# Altium footprint library con-amp.PCBLIB: 295 footprints (part 9 of 19)
Each footprint in its own frame and in the unit in brackets; x right, y up, seen from the top. Pads: shape width x height; smd on the part's side, far side on the other; paste and mask are expansions set on the pad; w line width, h text height; cw(c..) or ccw(c..) is an arc to the next point about the centre after c.
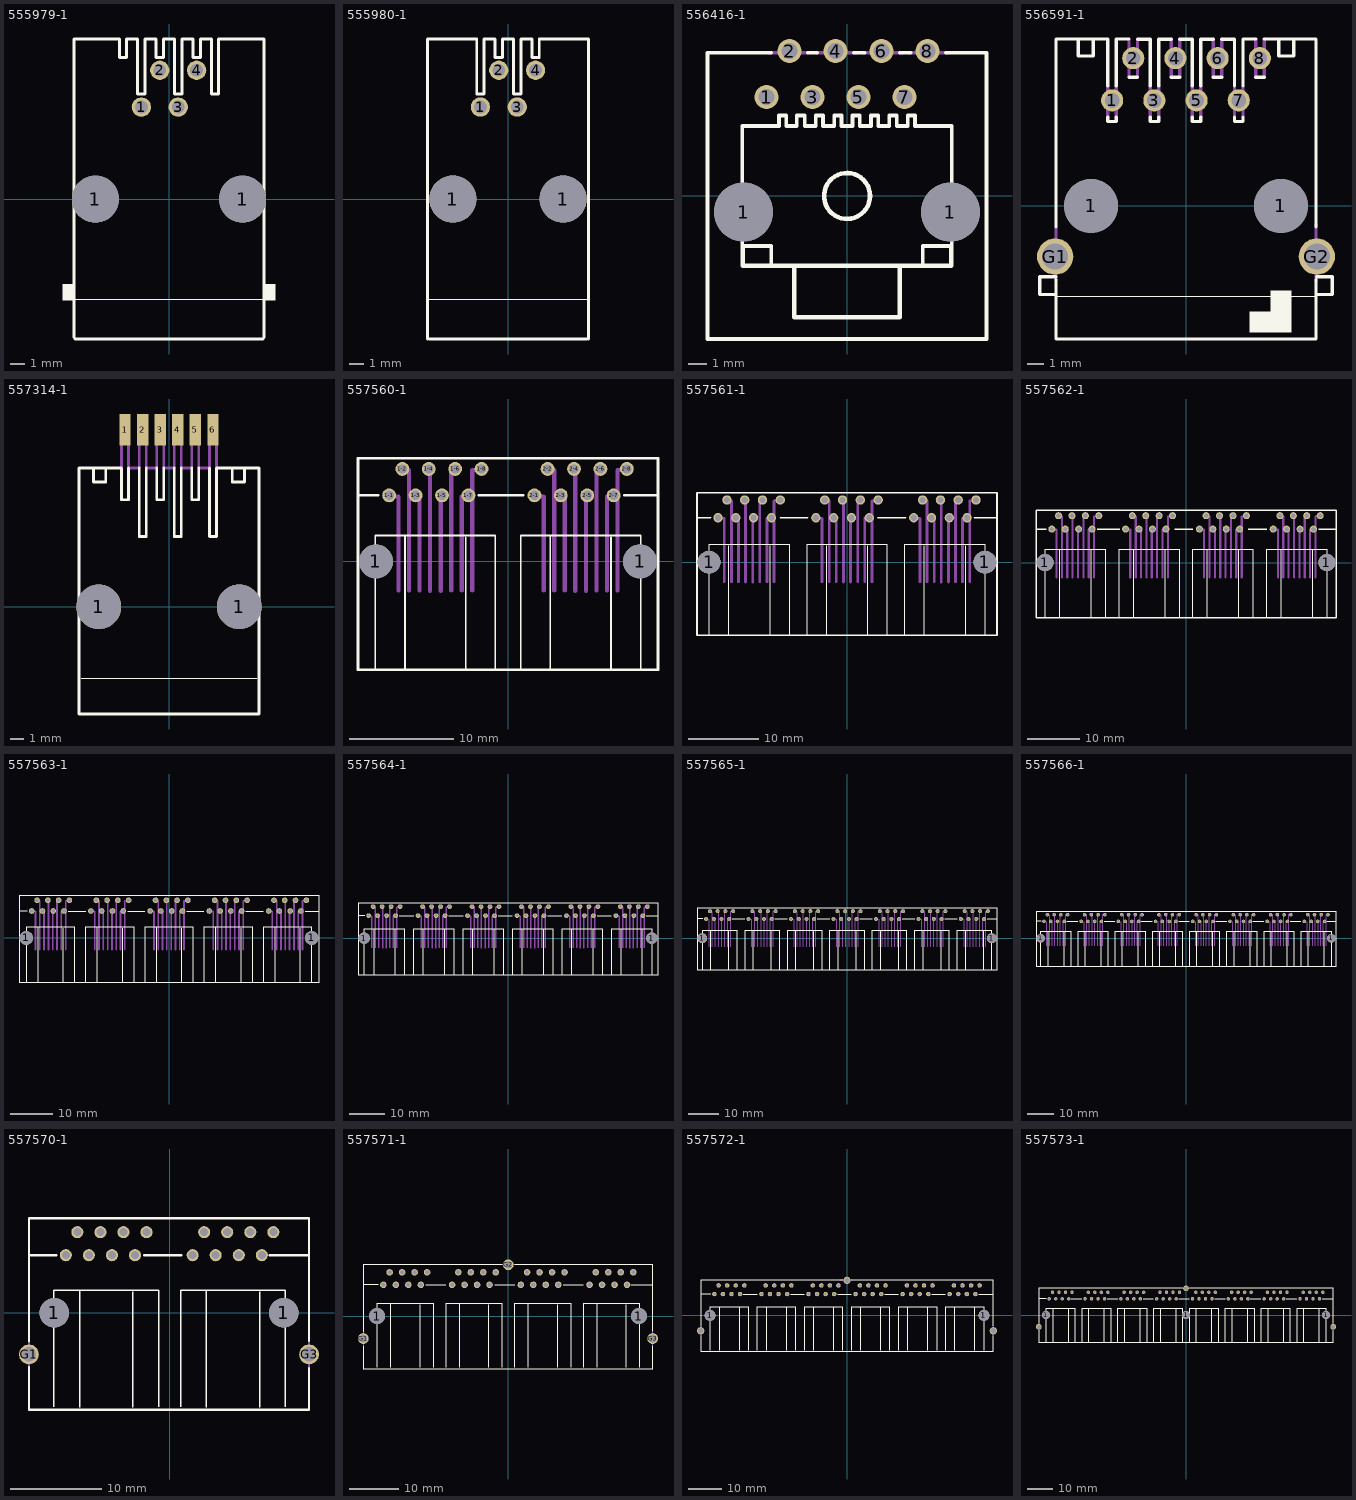
[diagram p8: the footprints below, top view; thin cyan lines are the x and y axes]

## 555979-1 [mil]
pads (6):
  round 128 hole 128: 1(-200,0) 1(200,0)
  round 52.5 hole 35: 1(-75,250) 2(-25,350) 3(25,250) 4(75,350)
Top Overlay:
  rectangle: -290,-275 -260,-230
  rectangle: 260,-275 290,-230
  lines w2: -257.5,-272.5 257.5,-272.5
  lines w8: -258.35,-375.51 -258.35,434.8 -135,435 -135,385 -115,385 -115,434.8 ; -255,-380 255,-380 ; -115,435 -115,434.8 ; -85,435 -85,434.8 ; 115,434.8 85,434.8 85,385 65,385 65,435 35,435 35,285 15,285 15,435 -15,435 -15,385 -35,385 -35,435 -65,435 -65,285 -85,285 -85,434.8 ; 115,435 115,285 135,285 135,435 258.35,434.8 258.35,-375.51 ; -115,434.8 -85,434.8

## 555980-1 [mil]
pads (6):
  round 128 hole 128: 1(-150,0) 1(150,0)
  round 52.5 hole 35: 1(-75,250) 2(-25,350) 3(25,250) 4(75,350)
Top Overlay:
  lines w2: -217.5,-272.5 217.5,-272.5
  lines w8: -218.35,-380.51 -218.35,434.8 -85,434.8 ; -215,-380 215,-380 ; -85,435 -85,434.8 ; 85,435 85,434.8 ; 218.35,-380.51 218.35,434.8 85,434.8 ; -85,434.8 -85,285 -65,285 -65,435 -35,435 -35,385 -15,385 -15,435 15,435 15,285 35,285 35,435 65,435 65,385 85,385 85,434.8

## 556416-1 [mil]
pads (10):
  round 128 hole 128: 1(-225,-35) 1(225,-35)
  round 52.5 hole 35: 1(-175,215) 2(-125,315) 3(-75,215) 4(-25,315) 5(25,215) 6(75,315) 7(125,215) 8(175,315)
Top Overlay:
  circle w10: c0,0 r50
  lines w8: -165,-152 -165,-109 -228,-109 -228,152 -148,152 -148,175 -132,175 -132,152 -109,152 -109,175 -92,175 -92,152 -68,152 -68,175 -52,175 -52,152 -28,152 -28,175 -12,175 -12,152 12,152 12,175 28,175 28,152 52,152 52,175 68,175 68,152 92,152 92,175 108,175 108,152 132,152 132,175 148,175 148,152 228,152 228,-109 165,-109 165,-152 ; -165,311.02 -303.35,311.02 -303.35,-311.02 303.35,-311.02 303.35,311.02 215,311.02 ; -85,311.02 -65,311.02 ; 15,311.02 38.35,311.02 ; 115,311.02 138.35,311.02
  lines w10: -227,-110 -227,-152 227,-152 227,-111 ; -115,-154 -115,-264 115,-264 115,-154
Mechanical 16:
  lines w8: -170,311.02 -85,311.02 ; -65,311.02 20,311.02 ; 35,311.02 120,311.02 ; 135,311.02 220,311.02

## 556591-1 [mil]
pads (12):
  round 128 hole 128: 1(-225,0) 1(225,0)
  round 52.5 hole 35: 1(-175,250) 2(-125,350) 3(-75,250) 4(-25,350) 5(25,250) 6(75,350) 7(125,250) 8(175,350)
  round 86 hole 62: G1(-310,-120) G2(310,-120)
Top Overlay:
  rectangle: 150,-300 250,-250
  rectangle: 200,-250 250,-200
  lines w2: -310,-214 310,-214
  lines w8: -308.86,-168.23 -346.42,-168.23 -346.42,-209.88 -308.82,-209.88 ; -307.91,-175 -307.91,-315.39 307.91,-315.39 307.91,-175 ; -307.91,-50 -307.91,395.39 -185,395.39 ; -255,395 -255,355 -220,355 -220,395 ; -185,210 -185,200 -165,200 -165,210 ; -185,285 -185,395 ; -165,285 -165,395.39 -135,395.39 ; -135,305 -115,305 ; -115,395 -85,395 -85,285 ; -85,210 -85,200 -65,200 -65,210 ; -65,285 -65,395.39 ; -65,395 -35,395 ; -35,305 -15,305 ; -15,395 15,395 15,285 ; 15,210 15,200 35,200 35,210 ; 35,285 35,395.39 ; 35,395 65,395 ; 65,305 85,305 ; 85,395 115,395 115,285 ; 115,210 115,200 135,200 135,210 ; 135,285 135,395.39 165,395.39 ; 165,305 185,305 ; 185,395.39 307.91,395.39 307.91,-50 ; 220,395 220,355 255,355 255,395 ; 309.8,-209.88 346.42,-209.88 346.42,-168.23 309.84,-168.23
Mechanical 16:
  lines w8: -308,-175 -308,-50 ; -185,210 -185,285 ; -165,210 -165,285 ; -135,305 -135,395.39 ; -115,305 -115,395 ; -85,210 -85,285 ; -65,210 -65,285 ; -35,305 -35,395 ; -15,305 -15,395 ; 15,210 15,285 ; 35,210 35,285 ; 65,305 65,395 ; 85,305 85,395 ; 115,210 115,285 ; 135,210 135,285 ; 165,305 165,395.39 ; 185,305 185,395 ; 308,-177 308,-45

## 557314-1 [mil]
pads (8):
  round 128 hole 128: 1(-200,0) 1(200,0)
  rect 32x90 smd: 1(-125,504.06) 2(-75,504.06) 3(-25,504.06) 4(25,504.06) 5(75,504.06) 6(125,504.06)
Top Overlay:
  lines w2: -250,-203 250,-203
  lines w8: -215,395 -215,355 -180,355 -180,395 ; -115,395 -115,305 -135,305 -135,395.39 -255.91,395.39 -255.91,-305.39 255.91,-305.39 255.91,395.39 135,395.39 135,200 115,200 115,395 ; -85,395 -85,200 -65,200 -65,395.39 ; -35,395 -35,305 -15,305 -15,395 ; 15,395 15,200 35,200 35,395.39 ; 65,395 65,305 85,305 85,395 ; 180,395 180,355 215,355 215,395
Mechanical 16:
  lines w8: -135,400 -135,544.06 -115,544.06 -115,400 ; -115,395 -85,395 ; -85,400 -85,544.06 -65,544.06 -65,400 ; -65,395 -35,395 ; -35,400 -35,544.06 -15,544.06 -15,400 ; -15,395 15,395 ; 15,400 15,544.06 35,544.06 35,400 ; 35,395 65,395 ; 65,400 65,544.06 85,544.06 85,400 ; 85,395 115,395 ; 115,400 115,544.06 135,544.06 135,400

## 557560-1 [mil]
pads (18):
  round 128 hole 128: 1(-500,0) 1(500,0)
  round 52.5 hole 35: 1-1(-450,250) 1-2(-400,350) 1-3(-350,250) 1-4(-300,350) 1-5(-250,250) 1-6(-200,350) 1-7(-150,250) 1-8(-100,350) 2-1(100,250) 2-2(150,350) 2-3(200,250) 2-4(250,350) 2-5(300,250) 2-6(350,350) 2-7(400,250) 2-8(450,350)
Top Overlay:
  lines w6: -502,-408 -502,98 -48,98 -48,-408 ; -390,-410 -390,93 ; -160,-410 -160,92 ; 48,-408 48,98 502,98 502,-408 ; 160,-410 160,93 ; 390,-410 390,92
  lines w10: -492,250 -568,250 ; -110,250 -18,250 ; 25,250 -18,250 ; 58,250 -18,250 ; 440,250 568,250 ; -568,250 -568,390 568,390 568,250 ; -568,250 -568,-410 -390,-410 -160,-410 160,-410 390,-410 568,-410 568,250
Mechanical 16:
  lines w16: -450,250 -415,245 -415,-110 ; -400,349 -375,345 -375,-110 ; -350,250 -335,247 ; -335,-110 -335,245 ; -300,350 -295,349 ; -295,-111 -295,345 ; -255,-111 -255,245 ; -255,248 -250,250 ; -215,-110 -215,345 ; -215,347 -200,350 ; -175,-110 -175,245 ; -175,246 -150,250 ; -135,-110 -135,345 -100,350 ; 100,250 135,245 135,-110 ; 150,349 175,345 175,-110 ; 200,250 215,247 ; 215,-110 215,245 ; 250,350 255,349 ; 255,-111 255,345 ; 295,-111 295,245 ; 295,248 300,250 ; 335,-110 335,345 ; 335,347 350,350 ; 375,-110 375,245 ; 375,246 400,250 ; 415,-110 415,345 450,350

## 557561-1 [mil]
pads (26):
  round 128 hole 128: 1(-775,0) 1(775,0)
  round 52.5 hole 35: 1-1(-725,250) 1-2(-675,350) 1-3(-625,250) 1-4(-575,350) 1-5(-525,250) 1-6(-475,350) 1-7(-425,250) 1-8(-375,350) 2-1(-175,250) 2-2(-125,350) 2-3(-75,250) 2-4(-25,350) 2-5(25,250) 2-6(75,350) 2-7(125,250) 2-8(175,350) 3-1(375,250) 3-2(425,350) 3-3(475,250) 3-4(525,350) 3-5(575,250) 3-6(625,350) 3-7(675,250) 3-8(725,350)
Top Overlay:
  lines w6: -777,-408 -777,98 -323,98 -323,-408 ; -665,-410 -665,93 ; -435,-410 -435,92 ; -227,-408 -227,98 227,98 227,-408 ; -115,-410 -115,93 ; 115,-410 115,92 ; 323,-408 323,98 777,98 777,-408 ; 435,-410 435,93 ; 665,-410 665,92
  lines w10: -767,250 -843,250 ; -375,250 -220,250 ; 175,250 330,250 ; 715,250 843,250 ; -843,250 -843,390 843,390 843,250 ; -843,250 -843,-410 -665,-410 -435,-410 -115,-410 115,-410 435,-410 665,-410 843,-410 843,250
Mechanical 16:
  lines w16: -725,250 -690,245 -690,-110 ; -675,349 -650,345 -650,-110 ; -625,250 -610,247 ; -610,-110 -610,245 ; -575,350 -570,349 ; -570,-111 -570,345 ; -530,-111 -530,245 ; -530,248 -525,250 ; -490,-110 -490,345 ; -490,347 -475,350 ; -450,-110 -450,245 ; -450,246 -425,250 ; -410,-110 -410,345 -375,350 ; -175,250 -140,245 -140,-110 ; -125,349 -100,345 -100,-110 ; -75,250 -60,247 ; -60,-110 -60,245 ; -25,350 -20,349 ; -20,-111 -20,345 ; 20,-111 20,245 ; 20,248 25,250 ; 60,-110 60,345 ; 60,347 75,350 ; 100,-110 100,245 ; 100,246 125,250 ; 140,-110 140,345 175,350 ; 375,250 410,245 410,-110 ; 425,349 450,345 450,-110 ; 475,250 490,247 ; 490,-110 490,245 ; 525,350 530,349 ; 530,-111 530,345 ; 570,-111 570,245 ; 570,248 575,250 ; 610,-110 610,345 ; 610,347 625,350 ; 650,-110 650,245 ; 650,246 675,250 ; 690,-110 690,345 725,350

## 557562-1 [mil]
pads (34):
  round 128 hole 128: 1(-1050,0) 1(1050,0)
  round 52.5 hole 35: 1-1(-1000,250) 1-2(-950,350) 1-3(-900,250) 1-4(-850,350) 1-5(-800,250) 1-6(-750,350) 1-7(-700,250) 1-8(-650,350) 2-1(-450,250) 2-2(-400,350) 2-3(-350,250) 2-4(-300,350) 2-5(-250,250) 2-6(-200,350) 2-7(-150,250) 2-8(-100,350) 3-1(100,250) 3-2(150,350) 3-3(200,250) 3-4(250,350) 3-5(300,250) 3-6(350,350) 3-7(400,250) 3-8(450,350) 4-1(650,250) 4-2(700,350) 4-3(750,250) 4-4(800,350) 4-5(850,250) 4-6(900,350) 4-7(950,250) 4-8(1000,350)
Top Overlay:
  lines w6: -1052,-408 -1052,98 -598,98 -598,-408 ; -940,-410 -940,93 ; -710,-410 -710,92 ; -502,-408 -502,98 -48,98 -48,-408 ; -390,-410 -390,93 ; -160,-410 -160,92 ; 48,-408 48,98 502,98 502,-408 ; 160,-410 160,93 ; 390,-410 390,92 ; 598,-408 598,98 1052,98 1052,-408 ; 710,-410 710,93 ; 940,-410 940,92
  lines w10: -1042,250 -1118,250 ; -660,250 -568,250 ; -525,250 -568,250 ; -492,250 -568,250 ; -85,250 50,250 ; 465,250 600,250 ; 990,250 1118,250 ; -1118,250 -1118,390 1118,390 1118,250 ; -1118,250 -1118,-410 -940,-410 -710,-410 -390,-410 -160,-410 160,-410 390,-410 710,-410 940,-410 1118,-410 1118,250
Mechanical 16:
  lines w16: -1000,250 -965,245 -965,-110 ; -950,349 -925,345 -925,-110 ; -900,250 -885,247 ; -885,-110 -885,245 ; -850,350 -845,349 ; -845,-111 -845,345 ; -805,-111 -805,245 ; -805,248 -800,250 ; -765,-110 -765,345 ; -765,347 -750,350 ; -725,-110 -725,245 ; -725,246 -700,250 ; -685,-110 -685,345 -650,350 ; -450,250 -415,245 -415,-110 ; -400,349 -375,345 -375,-110 ; -350,250 -335,247 ; -335,-110 -335,245 ; -300,350 -295,349 ; -295,-111 -295,345 ; -255,-111 -255,245 ; -255,248 -250,250 ; -215,-110 -215,345 ; -215,347 -200,350 ; -175,-110 -175,245 ; -175,246 -150,250 ; -135,-110 -135,345 -100,350 ; 100,250 135,245 135,-110 ; 150,349 175,345 175,-110 ; 200,250 215,247 ; 215,-110 215,245 ; 250,350 255,349 ; 255,-111 255,345 ; 295,-111 295,245 ; 295,248 300,250 ; 335,-110 335,345 ; 335,347 350,350 ; 375,-110 375,245 ; 375,246 400,250 ; 415,-110 415,345 450,350 ; 650,250 685,245 685,-110 ; 700,349 725,345 725,-110 ; 750,250 765,247 ; 765,-110 765,245 ; 800,350 805,349 ; 805,-111 805,345 ; 845,-111 845,245 ; 845,248 850,250 ; 885,-110 885,345 ; 885,347 900,350 ; 925,-110 925,245 ; 925,246 950,250 ; 965,-110 965,345 1000,350

## 557563-1 [mil]
pads (42):
  round 128 hole 128: 1(-1325,0) 1(1325,0)
  round 52.5 hole 35: 1-1(-1275,250) 1-2(-1225,350) 1-3(-1175,250) 1-4(-1125,350) 1-5(-1075,250) 1-6(-1025,350) 1-7(-975,250) 1-8(-925,350) 2-1(-725,250) 2-2(-675,350) 2-3(-625,250) 2-4(-575,350) 2-5(-525,250) 2-6(-475,350) 2-7(-425,250) 2-8(-375,350) 3-1(-175,250) 3-2(-125,350) 3-3(-75,250) 3-4(-25,350) 3-5(25,250) 3-6(75,350) 3-7(125,250) 3-8(175,350) 4-1(375,250) 4-2(425,350) 4-3(475,250) 4-4(525,350) 4-5(575,250) 4-6(625,350) 4-7(675,250) 4-8(725,350) 5-1(925,250) 5-2(975,350) 5-3(1025,250) 5-4(1075,350) 5-5(1125,250) 5-6(1175,350) 5-7(1225,250) 5-8(1275,350)
Top Overlay:
  lines w6: -1327,-408 -1327,98 -873,98 -873,-408 ; -1215,-410 -1215,93 ; -985,-410 -985,92 ; -777,-408 -777,98 -323,98 -323,-408 ; -665,-410 -665,93 ; -435,-410 -435,92 ; -227,-408 -227,98 227,98 227,-408 ; -115,-410 -115,93 ; 115,-410 115,92 ; 323,-408 323,98 777,98 777,-408 ; 435,-410 435,93 ; 665,-410 665,92 ; 873,-408 873,98 1327,98 1327,-408 ; 985,-410 985,93 ; 1215,-410 1215,92
  lines w10: -1317,250 -1393,250 ; -935,250 -775,250 ; -385,250 -225,250 ; 165,250 325,250 ; 715,250 875,250 ; 1265,250 1393,250 ; -1393,250 -1393,390 1393,390 1393,250 ; -1393,250 -1393,-410 -1215,-410 -985,-410 -665,-410 -435,-410 -115,-410 115,-410 435,-410 665,-410 985,-410 1215,-410 1393,-410 1393,250
Mechanical 16:
  lines w16: -1275,250 -1240,245 -1240,-110 ; -1225,349 -1200,345 -1200,-110 ; -1175,250 -1160,247 ; -1160,-110 -1160,245 ; -1125,350 -1120,349 ; -1120,-111 -1120,345 ; -1080,-111 -1080,245 ; -1080,248 -1075,250 ; -1040,-110 -1040,345 ; -1040,347 -1025,350 ; -1000,-110 -1000,245 ; -1000,246 -975,250 ; -960,-110 -960,345 -925,350 ; -725,250 -690,245 -690,-110 ; -675,349 -650,345 -650,-110 ; -625,250 -610,247 ; -610,-110 -610,245 ; -575,350 -570,349 ; -570,-111 -570,345 ; -530,-111 -530,245 ; -530,248 -525,250 ; -490,-110 -490,345 ; -490,347 -475,350 ; -450,-110 -450,245 ; -450,246 -425,250 ; -410,-110 -410,345 -375,350 ; -175,250 -140,245 -140,-110 ; -125,349 -100,345 -100,-110 ; -75,250 -60,247 ; -60,-110 -60,245 ; -25,350 -20,349 ; -20,-111 -20,345 ; 20,-111 20,245 ; 20,248 25,250 ; 60,-110 60,345 ; 60,347 75,350 ; 100,-110 100,245 ; 100,246 125,250 ; 140,-110 140,345 175,350 ; 375,250 410,245 410,-110 ; 425,349 450,345 450,-110 ; 475,250 490,247 ; 490,-110 490,245 ; 525,350 530,349 ; 530,-111 530,345 ; 570,-111 570,245 ; 570,248 575,250 ; 610,-110 610,345 ; 610,347 625,350 ; 650,-110 650,245 ; 650,246 675,250 ; 690,-110 690,345 725,350 ; 925,250 960,245 960,-110 ; 975,349 1000,345 1000,-110 ; 1025,250 1040,247 ; 1040,-110 1040,245 ; 1075,350 1080,349 ; 1080,-111 1080,345 ; 1120,-111 1120,245 ; 1120,248 1125,250 ; 1160,-110 1160,345 ; 1160,347 1175,350 ; 1200,-110 1200,245 ; 1200,246 1225,250 ; 1240,-110 1240,345 1275,350

## 557564-1 [mil]
pads (50):
  round 128 hole 128: 1(-1600,0) 1(1600,0)
  round 52.5 hole 35: 1-1(-1550,250) 1-2(-1500,350) 1-3(-1450,250) 1-4(-1400,350) 1-5(-1350,250) 1-6(-1300,350) 1-7(-1250,250) 1-8(-1200,350) 2-1(-1000,250) 2-2(-950,350) 2-3(-900,250) 2-4(-850,350) 2-5(-800,250) 2-6(-750,350) 2-7(-700,250) 2-8(-650,350) 3-1(-450,250) 3-2(-400,350) 3-3(-350,250) 3-4(-300,350) 3-5(-250,250) 3-6(-200,350) 3-7(-150,250) 3-8(-100,350) 4-1(100,250) 4-2(150,350) 4-3(200,250) 4-4(250,350) 4-5(300,250) 4-6(350,350) 4-7(400,250) 4-8(450,350) 5-1(650,250) 5-2(700,350) 5-3(750,250) 5-4(800,350) 5-5(850,250) 5-6(900,350) 5-7(950,250) 5-8(1000,350) 6-1(1200,250) 6-2(1250,350) 6-3(1300,250) 6-4(1350,350) 6-5(1400,250) 6-6(1450,350) 6-7(1500,250) 6-8(1550,350)
Top Overlay:
  lines w6: -1602,-408 -1602,98 -1148,98 -1148,-408 ; -1490,-410 -1490,93 ; -1260,-410 -1260,92 ; -1052,-408 -1052,98 -598,98 -598,-408 ; -940,-410 -940,93 ; -710,-410 -710,92 ; -502,-408 -502,98 -48,98 -48,-408 ; -390,-410 -390,93 ; -160,-410 -160,92 ; 48,-408 48,98 502,98 502,-408 ; 160,-410 160,93 ; 390,-410 390,92 ; 598,-408 598,98 1052,98 1052,-408 ; 710,-410 710,93 ; 940,-410 940,92 ; 1148,-408 1148,98 1602,98 1602,-408 ; 1260,-410 1260,93 ; 1490,-410 1490,92
  lines w10: -1592,250 -1668,250 ; -1210,250 -1050,250 ; -660,250 -500,250 ; -110,250 50,250 ; 440,250 600,250 ; 990,250 1150,250 ; 1540,250 1668,250 ; -1668,250 -1668,390 1668,390 1668,250 ; -1668,250 -1668,-410 -1490,-410 -1260,-410 -940,-410 -710,-410 -390,-410 -160,-410 160,-410 390,-410 710,-410 940,-410 1260,-410 1490,-410 1668,-410 1668,250
Mechanical 16:
  lines w16: -1550,250 -1515,245 -1515,-110 ; -1500,349 -1475,345 -1475,-110 ; -1450,250 -1435,247 ; -1435,-110 -1435,245 ; -1400,350 -1395,349 ; -1395,-111 -1395,345 ; -1355,-111 -1355,245 ; -1355,248 -1350,250 ; -1315,-110 -1315,345 ; -1315,347 -1300,350 ; -1275,-110 -1275,245 ; -1275,246 -1250,250 ; -1235,-110 -1235,345 -1200,350 ; -1000,250 -965,245 -965,-110 ; -950,349 -925,345 -925,-110 ; -900,250 -885,247 ; -885,-110 -885,245 ; -850,350 -845,349 ; -845,-111 -845,345 ; -805,-111 -805,245 ; -805,248 -800,250 ; -765,-110 -765,345 ; -765,347 -750,350 ; -725,-110 -725,245 ; -725,246 -700,250 ; -685,-110 -685,345 -650,350 ; -450,250 -415,245 -415,-110 ; -400,349 -375,345 -375,-110 ; -350,250 -335,247 ; -335,-110 -335,245 ; -300,350 -295,349 ; -295,-111 -295,345 ; -255,-111 -255,245 ; -255,248 -250,250 ; -215,-110 -215,345 ; -215,347 -200,350 ; -175,-110 -175,245 ; -175,246 -150,250 ; -135,-110 -135,345 -100,350 ; 100,250 135,245 135,-110 ; 150,349 175,345 175,-110 ; 200,250 215,247 ; 215,-110 215,245 ; 250,350 255,349 ; 255,-111 255,345 ; 295,-111 295,245 ; 295,248 300,250 ; 335,-110 335,345 ; 335,347 350,350 ; 375,-110 375,245 ; 375,246 400,250 ; 415,-110 415,345 450,350 ; 650,250 685,245 685,-110 ; 700,349 725,345 725,-110 ; 750,250 765,247 ; 765,-110 765,245 ; 800,350 805,349 ; 805,-111 805,345 ; 845,-111 845,245 ; 845,248 850,250 ; 885,-110 885,345 ; 885,347 900,350 ; 925,-110 925,245 ; 925,246 950,250 ; 965,-110 965,345 1000,350 ; 1200,250 1235,245 1235,-110 ; 1250,349 1275,345 1275,-110 ; 1300,250 1315,247 ; 1315,-110 1315,245 ; 1350,350 1355,349 ; 1355,-111 1355,345 ; 1395,-111 1395,245 ; 1395,248 1400,250 ; 1435,-110 1435,345 ; 1435,347 1450,350 ; 1475,-110 1475,245 ; 1475,246 1500,250 ; 1515,-110 1515,345 1550,350

## 557565-1 [mil]
pads (58):
  round 128 hole 128: 1(-1875,0) 1(1875,0)
  round 52.5 hole 35: 1-1(-1825,250) 1-2(-1775,350) 1-3(-1725,250) 1-4(-1675,350) 1-5(-1625,250) 1-6(-1575,350) 1-7(-1525,250) 1-8(-1475,350) 2-1(-1275,250) 2-2(-1225,350) 2-3(-1175,250) 2-4(-1125,350) 2-5(-1075,250) 2-6(-1025,350) 2-7(-975,250) 2-8(-925,350) 3-1(-725,250) 3-2(-675,350) 3-3(-625,250) 3-4(-575,350) 3-5(-525,250) 3-6(-475,350) 3-7(-425,250) 3-8(-375,350) 4-1(-175,250) 4-2(-125,350) 4-3(-75,250) 4-4(-25,350) 4-5(25,250) 4-6(75,350) 4-7(125,250) 4-8(175,350) 5-1(375,250) 5-2(425,350) 5-3(475,250) 5-4(525,350) 5-5(575,250) 5-6(625,350) 5-7(675,250) 5-8(725,350) 6-1(925,250) 6-2(975,350) 6-3(1025,250) 6-4(1075,350) 6-5(1125,250) 6-6(1175,350) 6-7(1225,250) 6-8(1275,350) 7-1(1475,250) 7-2(1525,350) 7-3(1575,250) 7-4(1625,350) 7-5(1675,250) 7-6(1725,350) 7-7(1775,250) 7-8(1825,350)
Top Overlay:
  lines w6: -1877,-408 -1877,98 -1423,98 -1423,-408 ; -1765,-410 -1765,93 ; -1535,-410 -1535,92 ; -1327,-408 -1327,98 -873,98 -873,-408 ; -1215,-410 -1215,93 ; -985,-410 -985,92 ; -777,-408 -777,98 -323,98 -323,-408 ; -665,-410 -665,93 ; -435,-410 -435,92 ; -227,-408 -227,98 227,98 227,-408 ; -115,-410 -115,93 ; 115,-410 115,92 ; 323,-408 323,98 777,98 777,-408 ; 435,-410 435,93 ; 665,-410 665,92 ; 873,-408 873,98 1327,98 1327,-408 ; 985,-410 985,93 ; 1215,-410 1215,92 ; 1423,-408 1423,98 1877,98 1877,-408 ; 1535,-410 1535,93 ; 1765,-410 1765,92
  lines w10: -1867,250 -1943,250 ; -1485,250 -1325,250 ; -935,250 -775,250 ; -385,250 -225,250 ; 165,250 325,250 ; 715,250 875,250 ; 1265,250 1425,250 ; 1815,250 1943,250 ; -1943,250 -1943,390 1943,390 1943,250 ; -1943,250 -1943,-410 -1765,-410 -1535,-410 -1215,-410 -985,-410 -665,-410 -435,-410 -115,-410 115,-410 435,-410 665,-410 985,-410 1215,-410 1535,-410 1765,-410 1943,-410 1943,250
Mechanical 16:
  lines w16: -1825,250 -1790,245 -1790,-110 ; -1775,349 -1750,345 -1750,-110 ; -1725,250 -1710,247 ; -1710,-110 -1710,245 ; -1675,350 -1670,349 ; -1670,-111 -1670,345 ; -1630,-111 -1630,245 ; -1630,248 -1625,250 ; -1590,-110 -1590,345 ; -1590,347 -1575,350 ; -1550,-110 -1550,245 ; -1550,246 -1525,250 ; -1510,-110 -1510,345 -1475,350 ; -1275,250 -1240,245 -1240,-110 ; -1225,349 -1200,345 -1200,-110 ; -1175,250 -1160,247 ; -1160,-110 -1160,245 ; -1125,350 -1120,349 ; -1120,-111 -1120,345 ; -1080,-111 -1080,245 ; -1080,248 -1075,250 ; -1040,-110 -1040,345 ; -1040,347 -1025,350 ; -1000,-110 -1000,245 ; -1000,246 -975,250 ; -960,-110 -960,345 -925,350 ; -725,250 -690,245 -690,-110 ; -675,349 -650,345 -650,-110 ; -625,250 -610,247 ; -610,-110 -610,245 ; -575,350 -570,349 ; -570,-111 -570,345 ; -530,-111 -530,245 ; -530,248 -525,250 ; -490,-110 -490,345 ; -490,347 -475,350 ; -450,-110 -450,245 ; -450,246 -425,250 ; -410,-110 -410,345 -375,350 ; -175,250 -140,245 -140,-110 ; -125,349 -100,345 -100,-110 ; -75,250 -60,247 ; -60,-110 -60,245 ; -25,350 -20,349 ; -20,-111 -20,345 ; 20,-111 20,245 ; 20,248 25,250 ; 60,-110 60,345 ; 60,347 75,350 ; 100,-110 100,245 ; 100,246 125,250 ; 140,-110 140,345 175,350 ; 375,250 410,245 410,-110 ; 425,349 450,345 450,-110 ; 475,250 490,247 ; 490,-110 490,245 ; 525,350 530,349 ; 530,-111 530,345 ; 570,-111 570,245 ; 570,248 575,250 ; 610,-110 610,345 ; 610,347 625,350 ; 650,-110 650,245 ; 650,246 675,250 ; 690,-110 690,345 725,350 ; 925,250 960,245 960,-110 ; 975,349 1000,345 1000,-110 ; 1025,250 1040,247 ; 1040,-110 1040,245 ; 1075,350 1080,349 ; 1080,-111 1080,345 ; 1120,-111 1120,245 ; 1120,248 1125,250 ; 1160,-110 1160,345 ; 1160,347 1175,350 ; 1200,-110 1200,245 ; 1200,246 1225,250 ; 1240,-110 1240,345 1275,350 ; 1475,250 1510,245 1510,-110 ; 1525,349 1550,345 1550,-110 ; 1575,250 1590,247 ; 1590,-110 1590,245 ; 1625,350 1630,349 ; 1630,-111 1630,345 ; 1670,-111 1670,245 ; 1670,248 1675,250 ; 1710,-110 1710,345 ; 1710,347 1725,350 ; 1750,-110 1750,245 ; 1750,246 1775,250 ; 1790,-110 1790,345 1825,350

## 557566-1 [mil]
pads (66):
  round 128 hole 128: 1(-2150,0) 1(2150,0)
  round 52.5 hole 35: 1-1(-2100,250) 1-2(-2050,350) 1-3(-2000,250) 1-4(-1950,350) 1-5(-1900,250) 1-6(-1850,350) 1-7(-1800,250) 1-8(-1750,350) 2-1(-1550,250) 2-2(-1500,350) 2-3(-1450,250) 2-4(-1400,350) 2-5(-1350,250) 2-6(-1300,350) 2-7(-1250,250) 2-8(-1200,350) 3-1(-1000,250) 3-2(-950,350) 3-3(-900,250) 3-4(-850,350) 3-5(-800,250) 3-6(-750,350) 3-7(-700,250) 3-8(-650,350) 4-1(-450,250) 4-2(-400,350) 4-3(-350,250) 4-4(-300,350) 4-5(-250,250) 4-6(-200,350) 4-7(-150,250) 4-8(-100,350) 5-1(100,250) 5-2(150,350) 5-3(200,250) 5-4(250,350) 5-5(300,250) 5-6(350,350) 5-7(400,250) 5-8(450,350) 6-1(650,250) 6-2(700,350) 6-3(750,250) 6-4(800,350) 6-5(850,250) 6-6(900,350) 6-7(950,250) 6-8(1000,350) 7-1(1200,250) 7-2(1250,350) 7-3(1300,250) 7-4(1350,350) 7-5(1400,250) 7-6(1450,350) 7-7(1500,250) 7-8(1550,350) 8-1(1750,250) 8-2(1800,350) 8-3(1850,250) 8-4(1900,350) 8-5(1950,250) 8-6(2000,350) 8-7(2050,250) 8-8(2100,350)
Top Overlay:
  lines w6: -2152,-408 -2152,98 -1698,98 -1698,-408 ; -2040,-410 -2040,93 ; -1810,-410 -1810,92 ; -1602,-408 -1602,98 -1148,98 -1148,-408 ; -1490,-410 -1490,93 ; -1260,-410 -1260,92 ; -1052,-408 -1052,98 -598,98 -598,-408 ; -940,-410 -940,93 ; -710,-410 -710,92 ; -502,-408 -502,98 -48,98 -48,-408 ; -390,-410 -390,93 ; -160,-410 -160,92 ; 48,-408 48,98 502,98 502,-408 ; 160,-410 160,93 ; 390,-410 390,92 ; 598,-408 598,98 1052,98 1052,-408 ; 710,-410 710,93 ; 940,-410 940,92 ; 1148,-408 1148,98 1602,98 1602,-408 ; 1260,-410 1260,93 ; 1490,-410 1490,92 ; 1698,-408 1698,98 2152,98 2152,-408 ; 1810,-410 1810,93 ; 2040,-410 2040,92
  lines w10: -2142,250 -2218,250 ; -1760,250 -1600,250 ; -1210,250 -1050,250 ; -660,250 -500,250 ; -110,250 50,250 ; 440,250 600,250 ; 990,250 1150,250 ; 1540,250 1700,250 ; 2090,250 2218,250 ; -2218,250 -2218,390 2218,390 2218,250 ; -2218,250 -2218,-410 -2040,-410 -1810,-410 -1490,-410 -1260,-410 -940,-410 -710,-410 -390,-410 -160,-410 160,-410 390,-410 710,-410 940,-410 1260,-410 1490,-410 1810,-410 2040,-410 2218,-410 2218,250
Mechanical 16:
  lines w16: -2100,250 -2065,245 -2065,-110 ; -2050,349 -2025,345 -2025,-110 ; -2000,250 -1985,247 ; -1985,-110 -1985,245 ; -1950,350 -1945,349 ; -1945,-111 -1945,345 ; -1905,-111 -1905,245 ; -1905,248 -1900,250 ; -1865,-110 -1865,345 ; -1865,347 -1850,350 ; -1825,-110 -1825,245 ; -1825,246 -1800,250 ; -1785,-110 -1785,345 -1750,350 ; -1550,250 -1515,245 -1515,-110 ; -1500,349 -1475,345 -1475,-110 ; -1450,250 -1435,247 ; -1435,-110 -1435,245 ; -1400,350 -1395,349 ; -1395,-111 -1395,345 ; -1355,-111 -1355,245 ; -1355,248 -1350,250 ; -1315,-110 -1315,345 ; -1315,347 -1300,350 ; -1275,-110 -1275,245 ; -1275,246 -1250,250 ; -1235,-110 -1235,345 -1200,350 ; -1000,250 -965,245 -965,-110 ; -950,349 -925,345 -925,-110 ; -900,250 -885,247 ; -885,-110 -885,245 ; -850,350 -845,349 ; -845,-111 -845,345 ; -805,-111 -805,245 ; -805,248 -800,250 ; -765,-110 -765,345 ; -765,347 -750,350 ; -725,-110 -725,245 ; -725,246 -700,250 ; -685,-110 -685,345 -650,350 ; -450,250 -415,245 -415,-110 ; -400,349 -375,345 -375,-110 ; -350,250 -335,247 ; -335,-110 -335,245 ; -300,350 -295,349 ; -295,-111 -295,345 ; -255,-111 -255,245 ; -255,248 -250,250 ; -215,-110 -215,345 ; -215,347 -200,350 ; -175,-110 -175,245 ; -175,246 -150,250 ; -135,-110 -135,345 -100,350 ; 100,250 135,245 135,-110 ; 150,349 175,345 175,-110 ; 200,250 215,247 ; 215,-110 215,245 ; 250,350 255,349 ; 255,-111 255,345 ; 295,-111 295,245 ; 295,248 300,250 ; 335,-110 335,345 ; 335,347 350,350 ; 375,-110 375,245 ; 375,246 400,250 ; 415,-110 415,345 450,350 ; 650,250 685,245 685,-110 ; 700,349 725,345 725,-110 ; 750,250 765,247 ; 765,-110 765,245 ; 800,350 805,349 ; 805,-111 805,345 ; 845,-111 845,245 ; 845,248 850,250 ; 885,-110 885,345 ; 885,347 900,350 ; 925,-110 925,245 ; 925,246 950,250 ; 965,-110 965,345 1000,350 ; 1200,250 1235,245 1235,-110 ; 1250,349 1275,345 1275,-110 ; 1300,250 1315,247 ; 1315,-110 1315,245 ; 1350,350 1355,349 ; 1355,-111 1355,345 ; 1395,-111 1395,245 ; 1395,248 1400,250 ; 1435,-110 1435,345 ; 1435,347 1450,350 ; 1475,-110 1475,245 ; 1475,246 1500,250 ; 1515,-110 1515,345 1550,350 ; 1750,250 1785,245 1785,-110 ; 1800,349 1825,345 1825,-110 ; 1850,250 1865,247 ; 1865,-110 1865,245 ; 1900,350 1905,349 ; 1905,-111 1905,345 ; 1945,-111 1945,245 ; 1945,248 1950,250 ; 1985,-110 1985,345 ; 1985,347 2000,350 ; 2025,-110 2025,245 ; 2025,246 2050,250 ; 2065,-110 2065,345 2100,350

## 557570-1 [mil]
pads (20):
  round 128 hole 128: 1(-500,0) 1(495,0)
  round 52.5 hole 35: 1-1(-450,250) 1-2(-400,350) 1-3(-350,250) 1-4(-300,350) 1-5(-250,250) 1-6(-200,350) 1-7(-150,250) 1-8(-100,350) 2-1(100,250) 2-2(150,350) 2-3(200,250) 2-4(250,350) 2-5(300,250) 2-6(350,350) 2-7(400,250) 2-8(450,350)
  round 86 hole 62: G1(-610,-180) G3(605,-180)
Top Overlay:
  lines w6: -502,-408 -502,98 -48,98 -48,-408 ; -390,-410 -390,93 ; -160,-410 -160,92 ; 48,-408 48,98 502,98 502,-408 ; 160,-410 160,93 ; 390,-410 390,92
  lines w10: -610,-236 -610,-420 605,-420 605,-239 ; -610,-124 -610,250 ; -492,250 -610,250 ; -110,250 50,250 ; 435,250 605,250 ; 605,-122 605,250 ; -610,250 -610,410 605,410 605,250
Mechanical 16:
  lines w10: -610,-235 -610,-124 ; 605,-240 605,-122

## 557571-1 [mil]
pads (37):
  round 128 hole 128: 1(-1050,0) 1(1045,0)
  round 52.5 hole 35: 1-1(-1000,250) 1-2(-950,350) 1-3(-900,250) 1-4(-850,350) 1-5(-800,250) 1-6(-750,350) 1-7(-700,250) 1-8(-650,350) 2-1(-450,250) 2-2(-400,350) 2-3(-350,250) 2-4(-300,350) 2-5(-250,250) 2-6(-200,350) 2-7(-150,250) 2-8(-100,350) 3-1(100,250) 3-2(150,350) 3-3(200,250) 3-4(250,350) 3-5(300,250) 3-6(350,350) 3-7(400,250) 3-8(450,350) 4-1(650,250) 4-2(700,350) 4-3(750,250) 4-4(800,350) 4-5(850,250) 4-6(900,350) 4-7(950,250) 4-8(1000,350)
  round 86 hole 62: G1(-1160,-180) G2(0,410) G3(1155,-180)
Top Overlay:
  lines w6: -1052,-408 -1052,98 -598,98 -598,-408 ; -940,-410 -940,93 ; -710,-410 -710,92 ; -502,-408 -502,98 -48,98 -48,-408 ; -390,-410 -390,93 ; -160,-410 -160,92 ; 48,-408 48,98 502,98 502,-408 ; 160,-410 160,93 ; 390,-410 390,92 ; 598,-408 598,98 1052,98 1052,-408 ; 710,-410 710,93 ; 940,-410 940,92
  lines w10: -1160,-236 -1160,-420 1155,-420 1155,-239 ; -1160,-124 -1160,250 ; -1042,250 -1160,250 ; -660,250 -500,250 ; -110,250 50,250 ; -50,410 -1160,410 -1160,250 ; 50,410 1155,410 1155,250 ; 440,250 600,250 ; 985,250 1155,250 ; 1155,-122 1155,250
Mechanical 16:
  lines w10: -1160,-235 -1160,-124 ; -61,410 60,410 ; 1155,-240 1155,-122

## 557572-1 [mil]
pads (53):
  round 128 hole 128: 1(-1600,0) 1(1600,0)
  round 52.5 hole 35: 1-1(-1550,250) 1-2(-1500,350) 1-3(-1450,250) 1-4(-1400,350) 1-5(-1350,250) 1-6(-1300,350) 1-7(-1250,250) 1-8(-1200,350) 2-1(-1000,250) 2-2(-950,350) 2-3(-900,250) 2-4(-850,350) 2-5(-800,250) 2-6(-750,350) 2-7(-700,250) 2-8(-650,350) 3-1(-450,250) 3-2(-400,350) 3-3(-350,250) 3-4(-300,350) 3-5(-250,250) 3-6(-200,350) 3-7(-150,250) 3-8(-100,350) 4-1(100,250) 4-2(150,350) 4-3(200,250) 4-4(250,350) 4-5(300,250) 4-6(350,350) 4-7(400,250) 4-8(450,350) 5-1(650,250) 5-2(700,350) 5-3(750,250) 5-4(800,350) 5-5(850,250) 5-6(900,350) 5-7(950,250) 5-8(1000,350) 6-1(1200,250) 6-2(1250,350) 6-3(1300,250) 6-4(1350,350) 6-5(1400,250) 6-6(1450,350) 6-7(1500,250) 6-8(1550,350)
  round 86 hole 62: G1(-1710,-180) G2(0,410) G3(1710,-180)
Top Overlay:
  lines w6: -1602,-408 -1602,98 -1148,98 -1148,-408 ; -1490,-410 -1490,93 ; -1260,-410 -1260,92 ; -1052,-408 -1052,98 -598,98 -598,-408 ; -940,-410 -940,93 ; -710,-410 -710,92 ; -502,-408 -502,98 -48,98 -48,-408 ; -390,-410 -390,93 ; -160,-410 -160,92 ; 48,-408 48,98 502,98 502,-408 ; 160,-410 160,93 ; 390,-410 390,92 ; 598,-408 598,98 1052,98 1052,-408 ; 710,-410 710,93 ; 940,-410 940,92 ; 1148,-408 1148,98 1602,98 1602,-408 ; 1260,-410 1260,93 ; 1490,-410 1490,92
  lines w10: -1710,-236 -1710,-420 1710,-420 1710,-239 ; -1710,-124 -1710,250 ; -1592,250 -1710,250 ; -1210,250 -1050,250 ; -660,250 -500,250 ; -110,250 50,250 ; -50,410 -1710,410 -1710,250 ; 50,410 1710,410 1710,250 ; 440,250 600,250 ; 990,250 1150,250 ; 1540,250 1710,250 ; 1710,-122 1710,250
Mechanical 16:
  lines w10: -1710,-235 -1710,-124 ; -86,410 60,410 ; 1710,-240 1710,-122

## 557573-1 [mil]
pads (70):
  round 128 hole 128: 1(-2150,0) 1(0,0) 1(2150,0)
  round 52.5 hole 35: 1-1(-2100,250) 1-2(-2050,350) 1-3(-2000,250) 1-4(-1950,350) 1-5(-1900,250) 1-6(-1850,350) 1-7(-1800,250) 1-8(-1750,350) 2-1(-1550,250) 2-2(-1500,350) 2-3(-1450,250) 2-4(-1400,350) 2-5(-1350,250) 2-6(-1300,350) 2-7(-1250,250) 2-8(-1200,350) 3-1(-1000,250) 3-2(-950,350) 3-3(-900,250) 3-4(-850,350) 3-5(-800,250) 3-6(-750,350) 3-7(-700,250) 3-8(-650,350) 4-1(-450,250) 4-2(-400,350) 4-3(-350,250) 4-4(-300,350) 4-5(-250,250) 4-6(-200,350) 4-7(-150,250) 4-8(-100,350) 5-1(100,250) 5-2(150,350) 5-3(200,250) 5-4(250,350) 5-5(300,250) 5-6(350,350) 5-7(400,250) 5-8(450,350) 6-1(650,250) 6-2(700,350) 6-3(750,250) 6-4(800,350) 6-5(850,250) 6-6(900,350) 6-7(950,250) 6-8(1000,350) 7-1(1200,250) 7-2(1250,350) 7-3(1300,250) 7-4(1350,350) 7-5(1400,250) 7-6(1450,350) 7-7(1500,250) 7-8(1550,350) 8-1(1750,250) 8-2(1800,350) 8-3(1850,250) 8-4(1900,350) 8-5(1950,250) 8-6(2000,350) 8-7(2050,250) 8-8(2100,350)
  round 86 hole 62: G1(-2260,-180) G2(0,410) G3(2260,-180)
Top Overlay:
  lines w6: -2152,-408 -2152,98 -1698,98 -1698,-408 ; -2040,-410 -2040,93 ; -1810,-410 -1810,92 ; -1602,-408 -1602,98 -1148,98 -1148,-408 ; -1490,-410 -1490,93 ; -1260,-410 -1260,92 ; -1052,-408 -1052,98 -598,98 -598,-408 ; -940,-410 -940,93 ; -710,-410 -710,92 ; -502,-408 -502,98 -48,98 -48,-408 ; -390,-410 -390,93 ; -160,-410 -160,92 ; 48,-408 48,98 502,98 502,-408 ; 160,-410 160,93 ; 390,-410 390,92 ; 598,-408 598,98 1052,98 1052,-408 ; 710,-410 710,93 ; 940,-410 940,92 ; 1148,-408 1148,98 1602,98 1602,-408 ; 1260,-410 1260,93 ; 1490,-410 1490,92 ; 1698,-408 1698,98 2152,98 2152,-408 ; 1810,-410 1810,93 ; 2040,-410 2040,92
  lines w10: -2260,-236 -2260,-420 2260,-420 2260,-239 ; -2260,-124 -2260,250 ; -2142,250 -2260,250 ; -1760,250 -1600,250 ; -1210,250 -1050,250 ; -660,250 -500,250 ; -110,250 50,250 ; -61,410 -2260,410 -2260,250 ; 60,410 2260,410 2260,250 ; 440,250 600,250 ; 990,250 1150,250 ; 1540,250 1700,250 ; 2090,250 2260,250 ; 2260,-122 2260,250
Mechanical 16:
  lines w10: -2260,-235 -2260,-124 ; -61,410 60,410 ; 2260,-240 2260,-122